# Altium footprint library CONECTER.PcbLib: 120 footprints (part 7 of 8)
Each footprint in its own frame and in the unit in brackets; x right, y up, seen from the top. Pads: shape width x height; smd on the part's side, far side on the other; paste and mask are expansions set on the pad; w line width, h text height; cw(c..) or ccw(c..) is an arc to the next point about the centre after c.
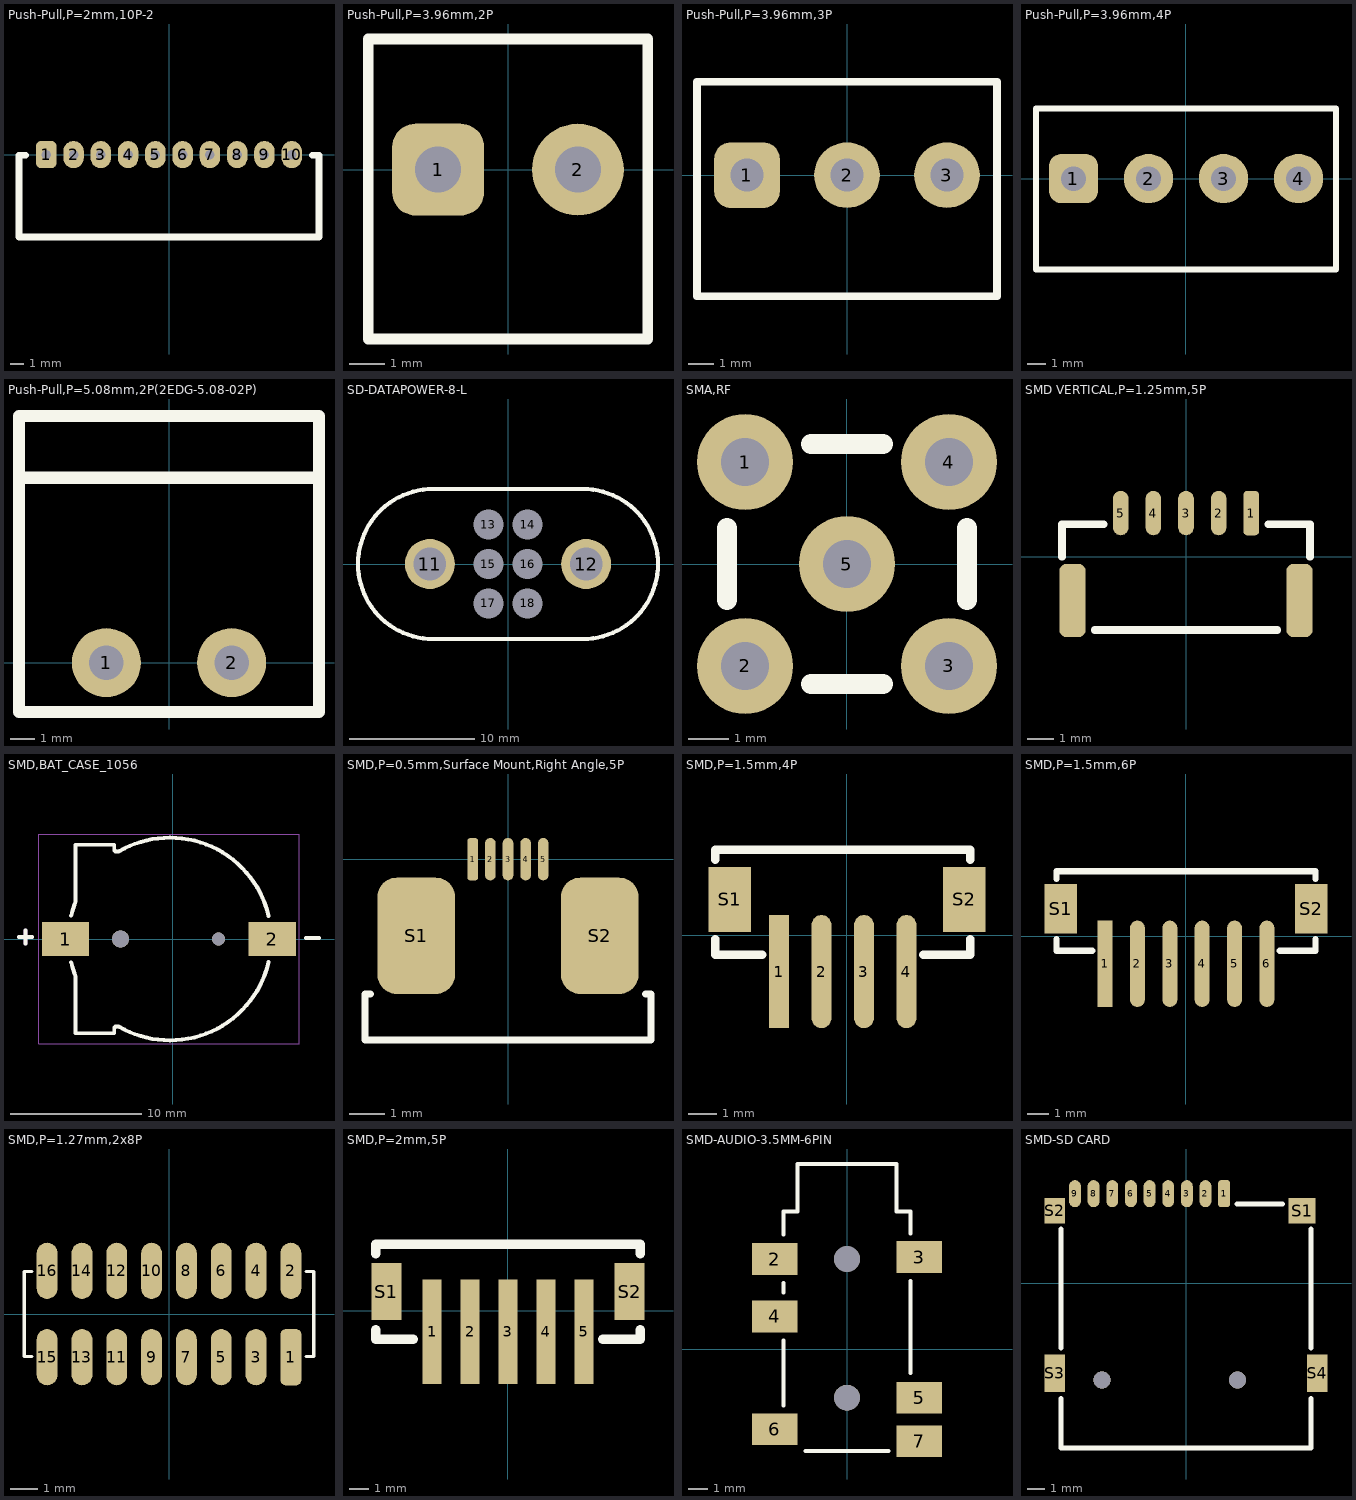
[diagram p6: the footprints below, top view; thin cyan lines are the x and y axes]

## Push-Pull,P=2mm,10P-2 [mm]
pads (10):
  rrect50% 1.5x2 hole 0.7 mask+0.15: 1(-9,0)
  oval 1.5x2 hole 0.7 mask+0.15: 2(-7,0) 3(-5,0) 4(-3,0) 5(-1,0) 6(1,0) 7(3,0) 8(5,0) 9(7,0) 10(9,0)
Top Overlay:
  lines w0.5: -10.5,-0.05 -11,-0.05 -11,-6.05 11,-6.05 11,-0.05 10.5,-0.05
3D body "JST-S10B-PH-K-S.STEP": height 4.8, standoff -3.4, extent -10.95,-6.1 10.95,1.5

## Push-Pull,P=3.96mm,2P [mm]
pads (2):
  rrect50% 2.6x2.6 hole 1.3 mask+0.1: 1(-1.98,0)
  round 2.6 hole 1.3 mask+0.1: 2(1.98,0)
Top Overlay:
  lines w0.3: -3.96,-4.8 3.96,-4.8 3.96,3.7 -3.96,3.7 -3.96,-4.8
3D body "B2P-VH.stp": height 10.9, standoff -3.7, extent -3.93,-4.8 3.93,3.7

## Push-Pull,P=3.96mm,3P [mm]
pads (3):
  rrect50% 2.6x2.6 hole 1.3 mask+0.1: 1(-3.96,0)
  round 2.6 hole 1.3 mask+0.1: 2(0,0) 3(3.96,0)
Top Overlay:
  lines w0.3: -5.94,-4.8 5.94,-4.8 5.94,3.7 -5.94,3.7 -5.94,-4.8
3D body "B3P-VH.stp": height 10.9, standoff -3.7, extent -5.91,-4.8 5.91,3.7

## Push-Pull,P=3.96mm,4P [mm]
pads (4):
  rrect50% 2.6x2.6 hole 1.3 mask+0.1: 1(-5.94,0)
  round 2.6 hole 1.3 mask+0.1: 2(-1.98,0) 3(1.98,0) 4(5.94,0)
Top Overlay:
  lines w0.3: -7.92,-4.8 -7.92,3.7 7.92,3.7 7.92,-4.8 -7.92,-4.8
3D body "B4P-VH.stp": height 10.9, standoff -3.7, extent -7.89,-4.8 7.89,3.7

## Push-Pull,P=5.08mm,2P(2EDG-5.08-02P) [mm]
pads (2):
  round 2.8 hole 1.4: 1(-2.54,0) 2(2.54,0)
Top Overlay:
  lines w0.5: -6,7.5 6.06,7.5 ; -6.08,-2 6.08,-2 6.08,10 -6.08,10 -6.08,-2
3D body "2EDG-5.08-02P.STEP": height 3.45, standoff -16.11, extent -5.78,-1.35 5.78,19.73

## SD-DATAPOWER-8-L [mm]
pads (8):
  round 4 hole 2.6: 11(-6.25,0) 12(6.25,0)
  round 1.524 hole 2.4: 13(-1.575,3.15) 14(1.575,3.15) 15(-1.575,0) 16(1.575,0) 17(-1.575,-3.15) 18(1.575,-3.15)
Top Overlay:
  lines w0.33: -12,0 ccw(c-6,0) -6,-6 6,-6 ccw(c6,0) 12,0 ccw(c6,0) 6,6 -6,6 ccw(c-6,0) -12,0
3D body "SD-DATAPOWER-8-L.STEP": height 8.52, standoff -0.33, extent -18.5,-7.4 18.5,7.4

## SMA,RF [mm]
pads (5):
  round 2.4 hole 1.2 mask+0.2: 1(-2.55,2.55) 2(-2.55,-2.55) 3(2.55,-2.55) 4(2.55,2.55) 5(0,0)
Top Overlay:
  lines w0.5: -3,-0.9 -3,0.9 ; -0.9,-3 0.9,-3 ; -0.9,3 0.9,3 ; 3,-0.9 3,0.9
3D body "HJ-Tech-HJ-SMA175.STEP": height 6.27, standoff -3.3, extent -3.175,-3 3.175,14.2

## SMD VERTICAL,P=1.25mm,5P [mm]
pads (7):
  rrect50% 0.6x1.7 smd: 1(2.5,1.675)
  oval 0.6x1.7 smd: 2(1.25,1.675) 3(0,1.675) 4(-1.25,1.675) 5(-2.5,1.675)
  rrect50% 1x2.8 smd: ""(-4.35,-1.675) ""(4.35,-1.675)
Top Overlay:
  lines w0.3: -4.75,0 -4.75,1.25 -3.15,1.25 ; -3.5,-2.8 3.5,-2.8 ; 3.15,1.25 4.75,1.25 4.75,0
3D body "BM05B-GHS-TBT.STEP": height 4.25, standoff 0.05, extent -4.75,-2.825 4.75,2.125

## SMD,BAT_CASE_1056 [mm]
height 3.99
pads (4):
  rect 3.6x2.6 smd mask+0.15: 1(-8.18,0) 2(7.61,0)
  round 1.3 hole 1.3 unplated: ""(-3.98,0)
  round 1 hole 1 unplated: ""(3.51,0)
Top Overlay:
  lines w0.3: -11.735,0.16 -10.735,0.16 ; -11.235,-0.34 -11.235,0.66 ; -7.747,-1.778 ccw(c-0.484,-0.082) -7.4,-2.876 ; -7.747,1.778 cw(c-0.484,0.082) -7.4,2.876 ; -7.41,-2.85 -7.41,-7.2 -4.46,-7.2 -4.46,-6.88 ; -7.41,2.85 -7.41,7.2 -4.46,7.2 -4.46,6.88 ; -4.46,-6.881 cw(c-4.255,-6.87) -4.266,-6.665 cw(c-4.248,-7.014) -4.084,-6.705 ; -4.46,6.881 ccw(c-4.255,6.87) -4.266,6.665 ccw(c-4.248,7.014) -4.084,6.705 ; -4.078,-6.709 ccw(c-0.212,-0.013) -0.212,-7.745 ; -4.078,6.709 cw(c-0.212,0.013) -0.212,7.745 ; -0.21,-7.745 ccw(c-0.21,0) 7.33,-1.77 ; -0.21,7.745 cw(c-0.21,0) 7.33,1.77 ; 10.185,0.09 11.185,0.09
3D:
  lines w0.127: 10.185,0.09 11.185,0.09
  lines w0.3: -11.735,0.16 -10.735,0.16 ; -11.235,-0.34 -11.235,0.66
Mechanical 15:
  lines w0.05: -10.23,-8 9.66,-8 9.66,8 -10.23,8 -10.23,-8
3D body "1056--3DModel-STEP-630548.STEP": height 4.28, standoff -0.88, extent -9.658,-7.561 9.142,7.577

## SMD,P=0.5mm,Surface Mount,Right Angle,5P [mm]
pads (7):
  rrect50% 0.3x1.2 smd mask+0.1: 1(-1,0)
  oval 0.3x1.2 smd mask+0.1: 2(-0.5,0) 3(0,0) 4(0.5,0) 5(1,0)
  rrect50% 2.2x3.3 smd mask+0.15: S1(-2.6,-2.17) S2(2.6,-2.17)
Top Overlay:
  lines w0.2: -3.9,-3.82 -4.05,-3.82 -4.05,-5.12 4.05,-5.12 4.05,-3.82 3.9,-3.82
3D body "1734592-5.stp": height 2.1, standoff 0.05, extent -3.965,-5.13 3.965,-0.02

## SMD,P=1.5mm,4P [mm]
pads (6):
  rect 0.7x4 smd: 1(-2.4,-1.275)
  oval 0.7x4 smd: 2(-0.9,-1.275) 3(0.6,-1.275) 4(2.1,-1.275)
  rect 1.5x2.3 smd: S1(-4.15,1.275) S2(4.15,1.275)
Top Overlay:
  lines w0.3: -4.65,-0.125 -4.65,-0.675 -3,-0.675 ; -4.65,2.675 -4.65,3.025 4.35,3.025 4.35,2.675 ; 2.7,-0.675 4.35,-0.675 4.35,-0.125
3D body "B4B-ZR-SM4-TFT.STEP": height 5, standoff 0, extent -4.65,-2.175 4.35,3.025

## SMD,P=1.5mm,6P [mm]
pads (8):
  rect 0.7x4 smd: 1(-3.75,-1.275)
  oval 0.7x4 smd: 2(-2.25,-1.275) 3(-0.75,-1.275) 4(0.75,-1.275) 5(2.25,-1.275) 6(3.75,-1.275)
  rect 1.5x2.3 smd: S1(-5.8,1.275) S2(5.8,1.275)
Top Overlay:
  lines w0.3: -6,-0.125 -6,-0.675 -4.35,-0.675 ; -6,2.675 -6,3.025 6,3.025 6,2.675 ; 4.35,-0.675 6,-0.675 6,-0.125
3D body "B6B-ZR-SM4-TF.STEP": height 5, standoff 0, extent -6,-2.175 6,3.025

## SMD,P=1.27mm,2x8P [mm]
pads (16):
  rrect50% 0.76x2.05 smd: 1(4.445,-1.575)
  oval 0.76x2.05 smd: 2(4.445,1.575) 3(3.175,-1.575) 4(3.175,1.575) 5(1.905,-1.575) 6(1.905,1.575) 7(0.635,-1.575) 8(0.635,1.575) 9(-0.635,-1.575) 10(-0.635,1.575) 11(-1.905,-1.575) 12(-1.905,1.575) 13(-3.175,-1.575) 14(-3.175,1.575) 15(-4.445,-1.575) 16(-4.445,1.575)
Top Overlay:
  lines w0.127: -5,-1.55 -5.28,-1.55 -5.28,1.55 -5,1.55 ; 5,-1.55 5.28,-1.55 5.28,1.55 5,1.55
3D body "62301621021.stp": height 4.6, standoff -0.05, extent -5.28,-2.3 5.28,2.3

## SMD,P=2mm,5P [mm]
pads (7):
  rect 1x5.5 smd: 1(-4,-1.1) 2(-2,-1.1) 3(0,-1.1) 4(2,-1.1) 5(4,-1.1)
  rect 1.6x3 smd: S1(-6.4,1) S2(6.4,1)
Top Overlay:
  lines w0.5: -6.975,-1 -6.975,-1.5 -5,-1.5 ; -6.975,3 -6.975,3.5 6.975,3.5 6.975,3 ; 5,-1.5 6.975,-1.5 6.975,-1
3D body "B5B-PH-SM4-TBT (LF)(SN).STEP": height 6.75, standoff 0, extent -6.975,-3.5 6.975,3.5

## SMD-AUDIO-3.5MM-6PIN [mm]
pads (8):
  rect 2.3x1.6 smd mask+0.15: 2(-3.65,4.55) 3(3.65,4.65) 4(-3.65,1.65) 5(3.65,-2.45) 6(-3.65,-4.05) 7(3.65,-4.65)
  round 1.3 hole 1.3: ""(0,-2.45) ""(0,4.55)
Top Overlay:
  lines w0.2: -3.2,-2.85 -3.2,0.45 ; -3.2,2.85 -3.2,3.35 ; -3.2,5.8 -3.2,6.95 -2.5,6.95 -2.5,9.35 2.5,9.35 2.5,6.95 3.2,6.95 3.2,5.85 ; -2.1,-5.15 2.1,-5.15 ; 3.2,-1.2 3.2,3.45
3D body "PJ311D_WPos.STEP": height 4.8, standoff -0.7, extent -4.35,-5.45 4.15,8.85

## SMD-SD CARD [mm]
pads (13):
  rrect50% 0.7x1.6 smd mask+0.1: 1(2.25,5.3)
  oval 0.7x1.6 smd mask+0.1: 2(1.15,5.3) 3(0.05,5.3) 4(-1.05,5.3) 5(-2.15,5.3) 6(-3.25,5.3) 7(-4.35,5.3) 8(-5.45,5.3) 9(-6.55,5.3)
  rect 1.6x1.5 smd mask+0.1: S1(6.85,4.3)
  rect 1.2x1.5 smd mask+0.1: S2(-7.75,4.3)
  rect 1.2x2.2 smd mask+0.1: S3(-7.75,-5.3) S4(7.75,-5.3)
via 3.05,-5.7 diameter 1 hole 1
via -4.95,-5.7 diameter 1 hole 1
Top Overlay:
  lines w0.3: -7.375,-6.8 -7.375,-9.7 7.375,-9.7 7.375,-6.8 ; -7.375,-3.8 -7.375,3.2 ; 3,4.7 5.7,4.7 ; 7.375,-3.8 7.375,3.2
3D body "MICRO SD CARD SOCKET.step": height 1.84, standoff -0.6, extent -7.976,-12.281 8.024,5.619